# Altium footprint library Library.PcbLib: 292 footprints (part 7 of 20)
Each footprint in its own frame and in the unit in brackets; x right, y up, seen from the top. Pads: shape width x height; smd on the part's side, far side on the other; paste and mask are expansions set on the pad; w line width, h text height; cw(c..) or ccw(c..) is an arc to the next point about the centre after c.
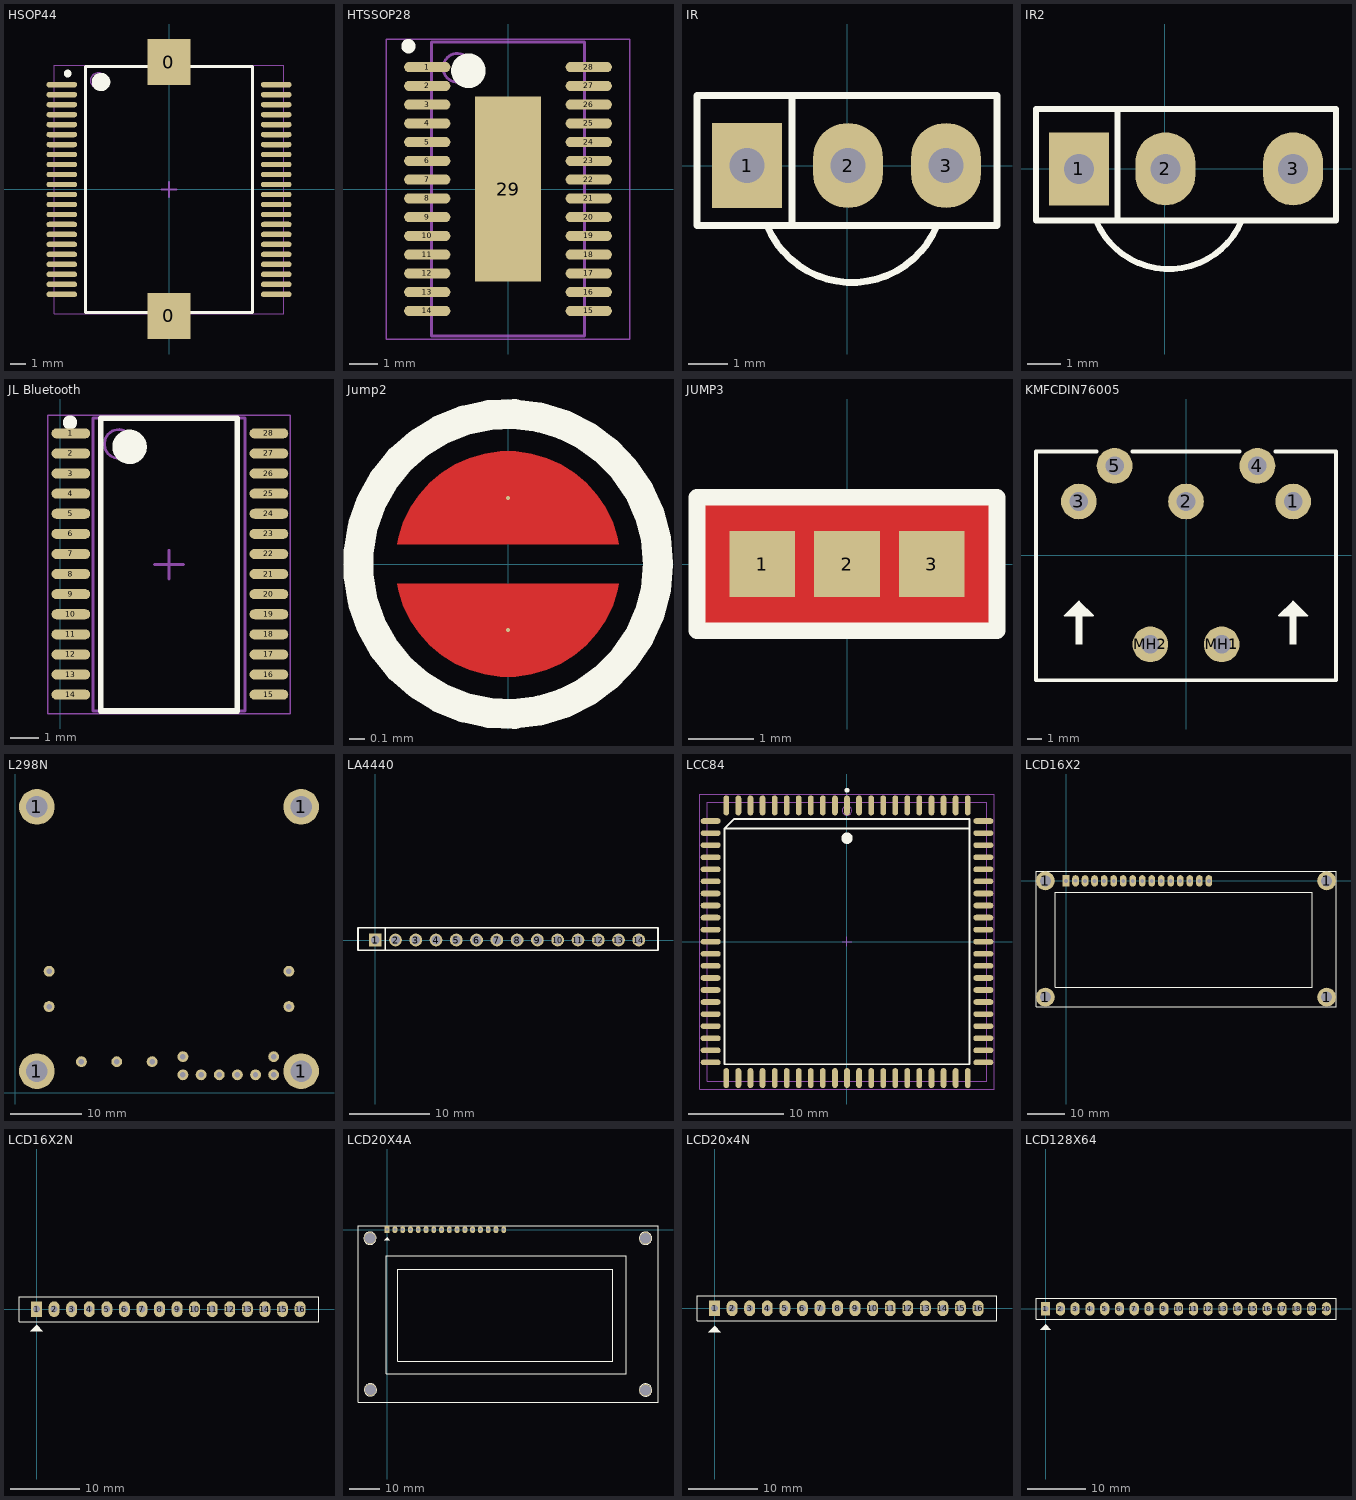
[diagram p6: the footprints below, top view; thin cyan lines are the x and y axes]

## HSOP44 [mm] "HSOP, 44-Leads, Body 16.00x11.00mm, Pitch 0.65mm, IPC High Density"
height 3
pads (46):
  rect 2.8x3 smd: 0(-0.012,-8.236) 0(-0.012,8.299)
  oval 2x0.35 smd: 1(-6.981,6.825) 2(-6.981,6.175) 3(-6.981,5.525) 4(-6.981,4.875) 5(-6.981,4.225) 6(-6.981,3.575) 7(-6.981,2.925) 8(-6.981,2.275) 9(-6.981,1.625) 10(-6.981,0.975) 11(-6.981,0.325) 12(-6.981,-0.325) 13(-6.981,-0.975) 14(-6.981,-1.625) 15(-6.981,-2.275) 16(-6.981,-2.925) 17(-6.981,-3.575) 18(-6.981,-4.225) 19(-6.981,-4.875) 20(-6.981,-5.525) 21(-6.981,-6.175) 22(-6.981,-6.825) 23(6.981,-6.825) 24(6.981,-6.175) 25(6.981,-5.525) 26(6.981,-4.875) 27(6.981,-4.225) 28(6.981,-3.575) 29(6.981,-2.925) 30(6.981,-2.275) 31(6.981,-1.625) 32(6.981,-0.975) 33(6.981,-0.325) 34(6.981,0.325) 35(6.981,0.975) 36(6.981,1.625) 37(6.981,2.275) 38(6.981,2.925) 39(6.981,3.575) 40(6.981,4.225) 41(6.981,4.875) 42(6.981,5.525) 43(6.981,6.175) 44(6.981,6.825)
Top Overlay:
  circle w0.6: c-4.425,7 r0.3
  circle w0.25: c-6.6,7.55 r0.125
  lines w0.2: -5.425,-8 5.425,-8 5.425,8 -5.425,8 -5.425,-8
Mechanical 13:
  circle w0.1: c-4.6,7.1 r0.5
  lines w0.1: -5.5,-8 5.5,-8 5.5,8 -5.5,8 -5.5,-8
Mechanical 15:
  lines w0.05: -7.475,-8.1 7.475,-8.1 7.475,8.1 -7.475,8.1 -7.475,-8.1
  lines w0.1: -0.5,0 0.5,0 ; 0,-0.5 0,0.5
3D body "User Library-HSOP Device (.step": height 3.4, standoff -0.05, extent -7.25,-8 7.25,8

## HTSSOP28 [mm] "HTSSOP, 28-Leads, Body 9.8x4.5mm, Pitch 0.65mm, IPC High Density"
height 1.2
pads (29):
  oval 1.6x0.35 smd: 1(-2.8,4.225) 2(-2.8,3.575) 3(-2.8,2.925) 4(-2.8,2.275) 5(-2.8,1.625) 6(-2.8,0.975) 7(-2.8,0.325) 8(-2.8,-0.325) 9(-2.8,-0.975) 10(-2.8,-1.625) 11(-2.8,-2.275) 12(-2.8,-2.925) 13(-2.8,-3.575) 14(-2.8,-4.225) 15(2.8,-4.225) 16(2.8,-3.575) 17(2.8,-2.925) 18(2.8,-2.275) 19(2.8,-1.625) 20(2.8,-0.975) 21(2.8,-0.325) 22(2.8,0.325) 23(2.8,0.975) 24(2.8,1.625) 25(2.8,2.275) 26(2.8,2.925) 27(2.8,3.575) 28(2.8,4.225)
  rect 2.3x6.4 smd: 29(0,0)
Top Overlay:
  circle w0.6: c-1.375,4.1 r0.3
  circle w0.25: c-3.45,4.95 r0.125
Mechanical 13:
  circle w0.1: c-1.75,4.2 r0.5
  lines w0.1: -2.65,-5.1 2.65,-5.1 2.65,5.1 -2.65,5.1 -2.65,-5.1
Mechanical 15:
  lines w0.05: -4.225,-5.2 4.225,-5.2 4.225,5.2 -4.225,5.2 -4.225,-5.2
  lines w0.1: -0.5,0 0.5,0 ; 0,-0.5 0,0.5
3D body "HTSSOP-28-1EP_4.4x9.7mm_P0.65mm_EP3.4x9.5mm.step": height 1.2, standoff 0, extent -3.2,-4.85 3.2,4.85

## IR [mil] "Receiver Infared IC"
height 200
pads (3):
  rect 70x85 hole 35: 1(-100,0)
  oval 70x85 hole 35: 2(1,0) 3(99,0)
Top Overlay:
  lines w7: -80,-60 ccw(c5,-25) 90,-60 ; -55,-60 -55,70 ; -150,-60 150,-60 150,70 -150,70 -150,-60
3D body "SW3dPS-TO92.STEP": height 245.04, standoff -199.79, extent -107.87,-99.53 109.87,61.03

## IR2 [mil] "Receiver Infared IC"
height 200
pads (3):
  rect 70x85 hole 35: 1(-100,0)
  oval 70x85 hole 35: 2(1,0) 3(150,0)
Top Overlay:
  lines w7: -80,-60 ccw(c5,-25) 90,-60 ; -55,-60 -55,70 ; -150,-60 200,-60 200,70 -150,70 -150,-60

## JL Bluetooth [mm]
pads (28):
  oval 1.35x0.35 smd: 1(0.364,13.612) 2(0.364,12.912) 3(0.364,12.212) 4(0.364,11.512) 5(0.364,10.812) 6(0.364,10.112) 7(0.364,9.412) 8(0.364,8.712) 9(0.364,8.012) 10(0.364,7.312) 11(0.364,6.612) 12(0.364,5.912) 13(0.364,5.212) 14(0.364,4.512) 15(7.264,4.512) 16(7.264,5.212) 17(7.264,5.912) 18(7.264,6.612) 19(7.264,7.312) 20(7.264,8.012) 21(7.264,8.712) 22(7.264,9.412) 23(7.264,10.112) 24(7.264,10.812) 25(7.264,11.512) 26(7.264,12.212) 27(7.264,12.912) 28(7.264,13.612)
Top Overlay:
  circle w0.6: c2.41,13.142 r0.3
  circle w0.25: c0.335,13.992 r0.125
  lines w0.2: 1.41,3.942 6.16,3.942 6.16,14.142 1.41,14.142 1.41,3.942
Mechanical 13:
  circle w0.1: c2.035,13.242 r0.5
  lines w0.1: 1.135,3.942 6.435,3.942 6.435,14.142 1.135,14.142 1.135,3.942
Mechanical 15:
  lines w0.05: -0.44,3.842 8.01,3.842 8.01,14.242 -0.44,14.242 -0.44,3.842
  lines w0.1: 3.285,9.042 4.285,9.042 ; 3.785,8.542 3.785,9.542

## Jump2 [mil]
pads (2):
  round 1 smd: 1(0,17.33) 2(0,-17.33)
Top Layer:
  region: 29.08,-5.13 28.72,-7.16 27.44,-11.09 25.63,-14.8 23.32,-18.22 20.56,-21.29 17.4,-23.95 13.9,-26.13 10.12,-27.81 6.15,-28.95 2.06,-29.53 -2.06,-29.53 -6.15,-28.95 -10.12,-27.81 -13.9,-26.13 -17.4,-23.95 -20.56,-21.29 -23.32,-18.22 -25.63,-14.8 -27.44,-11.09 -28.72,-7.16 -29.08,-5.13
  region: -29.08,5.13 -28.72,7.16 -27.44,11.09 -25.63,14.8 -23.32,18.22 -20.56,21.29 -17.4,23.95 -13.9,26.13 -10.12,27.81 -6.15,28.95 -2.06,29.53 2.06,29.53 6.15,28.95 10.12,27.81 13.9,26.13 17.4,23.95 20.56,21.29 23.32,18.22 25.63,14.8 27.44,11.09 28.72,7.16 29.08,5.13
Top Overlay:
  circle w7.87: c0,0 r39.37

## JUMP3 [mm]
pads (3):
  rect 1x1 smd: 1(-1.29,0) 2(0,0) 3(1.29,0)
Top Layer:
  pour cut-out: -2.286,-1.016 -2.286,1.016 2.286,1.016 2.286,-1.016
Top Overlay:
  lines w0.254: -2.286,-1.016 2.286,-1.016 2.286,1.016 -2.286,1.016 -2.286,-1.016

## KMFCDIN76005 [mm]
height 21.1
pads (7):
  round 2.5 hole 1.3: 1(7.5,3.75) 2(0,3.75) 3(-7.5,3.75) 4(5,6.25) 5(-5,6.25) MH1(2.5,-6.25) MH2(-2.5,-6.25)
Top Overlay:
  region: 7.75,-4.25 7.25,-4.25 7.25,-6.25 7.75,-6.25
  rectangle: -7.75,-6.25 -7.25,-4.25
  region: 8.5,-4.25 7.5,-3.25 6.5,-4.25
  region: -8.5,-4.25 -7.5,-3.25 -6.5,-4.25
  lines w0.127: -8.5,-4.25 -6.5,-4.25 -7.5,-3.25 -8.5,-4.25 ; 6.5,-4.25 8.5,-4.25 7.5,-3.25 6.5,-4.25
  lines w0.254: -6.25,7.25 -10.5,7.25 -10.5,-8.75 10.5,-8.75 10.5,7.25 6.25,7.25 ; -3.75,7.25 3.75,7.25
3D body "pin.stp": height 12.87, standoff -2.91, extent 0.427,5.764 5.72,7.313
3D body "5PINDIN.STEP": height 21.4, standoff -3.5, extent -10.34,-8.95 10.36,6.05
3D body "pin.stp": height 12.87, standoff -2.91, extent -5.72,5.087 -0.428,6.636
3D body: height 13.2, standoff 12, extent -0.89,4.62 -0.359,6.72
3D body: height 13.2, standoff 12, extent 0.39,4.64 0.921,6.74

## L298N [mil] "Module"
pads (19):
  round 196.85 hole 118.11: 1(118.11,118.11) 1(118.11,1574.8) 1(1574.8,118.11) 1(1574.8,1574.8)
  round 60 hole 30: +5V(753.31,170.26) +5V(923.26,197.89) +5V(1423.34,197.89) +12V(363.94,170.26) ENA(923.26,97.87) ENB(1423.34,97.87) GND(558.63,170.26) IN1(1023.28,97.87) IN2(1123.29,97.87) IN3(1223.31,97.87) IN4(1323.32,97.87) OUT1(185.43,668.92) OUT2(185.43,474.23) OUT3(1507.47,474.23) OUT4(1507.47,668.92)
3D body "User Library-L298N-3.step": height 1122.44, standoff -39.37, extent 0,-14.76 1692.91,1707.68

## LA4440 [mm]
height 8.54
pads (14):
  rect 1.6x1.6 hole 1.1: 1(0,0)
  round 1.6 hole 1.1: 2(2.54,0) 3(5.08,0) 4(7.62,0) 5(10.16,0) 6(12.7,0) 7(15.24,0) 8(17.78,0) 9(20.32,0) 10(22.86,0) 11(25.4,0) 12(27.94,0) 13(30.48,0) 14(33.02,0)
Top Overlay:
  lines w0.2: 1.27,-1.27 1.27,1.524 ; -2.159,-1.27 -2.159,1.524 0.889,1.524 35.433,1.524 35.433,-1.27 -2.159,-1.27
3D body: height 15, standoff 4.5, extent -2.159,-1.397 35.433,1.651
3D body "61301411121.stp": height 10.17, standoff -1.37, extent -1.27,-1.27 34.29,1.27

## LCC84 [mm] "Leaded Chip Carrier, 84-Leads, Body 29.3x29.3mm, Pitch 1.27mm, IPC High Density"
height 5.08
pads (84):
  oval 0.6x2.1 smd: 1(0,14.35) 2(-1.27,14.35) 3(-2.54,14.35) 4(-3.81,14.35) 5(-5.08,14.35) 6(-6.35,14.35) 7(-7.62,14.35) 8(-8.89,14.35) 9(-10.16,14.35) 10(-11.43,14.35) 11(-12.7,14.35) 33(-12.7,-14.35) 34(-11.43,-14.35) 35(-10.16,-14.35) 36(-8.89,-14.35) 37(-7.62,-14.35) 38(-6.35,-14.35) 39(-5.08,-14.35) 40(-3.81,-14.35) 41(-2.54,-14.35) 42(-1.27,-14.35) 43(0,-14.35) 44(1.27,-14.35) 45(2.54,-14.35) 46(3.81,-14.35) 47(5.08,-14.35) 48(6.35,-14.35) 49(7.62,-14.35) 50(8.89,-14.35) 51(10.16,-14.35) 52(11.43,-14.35) 53(12.7,-14.35) 75(12.7,14.35) 76(11.43,14.35) 77(10.16,14.35) 78(8.89,14.35) 79(7.62,14.35) 80(6.35,14.35) 81(5.08,14.35) 82(3.81,14.35) 83(2.54,14.35) 84(1.27,14.35)
  oval 2.1x0.6 smd: 12(-14.35,12.7) 13(-14.35,11.43) 14(-14.35,10.16) 15(-14.35,8.89) 16(-14.35,7.62) 17(-14.35,6.35) 18(-14.35,5.08) 19(-14.35,3.81) 20(-14.35,2.54) 21(-14.35,1.27) 22(-14.35,0) 23(-14.35,-1.27) 24(-14.35,-2.54) 25(-14.35,-3.81) 26(-14.35,-5.08) 27(-14.35,-6.35) 28(-14.35,-7.62) 29(-14.35,-8.89) 30(-14.35,-10.16) 31(-14.35,-11.43) 32(-14.35,-12.7) 54(14.35,-12.7) 55(14.35,-11.43) 56(14.35,-10.16) 57(14.35,-8.89) 58(14.35,-7.62) 59(14.35,-6.35) 60(14.35,-5.08) 61(14.35,-3.81) 62(14.35,-2.54) 63(14.35,-1.27) 64(14.35,0) 65(14.35,1.27) 66(14.35,2.54) 67(14.35,3.81) 68(14.35,5.08) 69(14.35,6.35) 70(14.35,7.62) 71(14.35,8.89) 72(14.35,10.16) 73(14.35,11.43) 74(14.35,12.7)
Top Overlay:
  circle w0.25: c0,15.95 r0.125
  circle w0.6: c0,10.9 r0.3
  lines w0.2: 12.9,11.9 -12.9,11.9 ; -12.9,11.9 -11.9,12.9 12.9,12.9 12.9,-12.9 -12.9,-12.9 -12.9,11.9
Mechanical 13:
  circle w0.1: c0,13.805 r0.5
  lines w0.1: -14.705,-14.705 -14.705,14.705 14.705,14.705 14.705,-14.705 -14.705,-14.705
Mechanical 15:
  lines w0.1: -0.5,0 0.5,0 ; 0,-0.5 0,0.5 ; -15.5,-15.5 -15.5,15.5 15.5,15.5 15.5,-15.5 -15.5,-15.5
3D body "LCC127P2930X2930X200-84N.step": height 2, standoff 0, extent -14.605,-14.568 14.695,14.732

## LCD16X2 [mm] "LCD dipslay 16x2, 16 pin"
height 10.16
pads (21):
  round 5 hole 3: 1(-5.5,-31) 1(-5.5,0) 1(69.5,-31) 1(69.5,0)
  rect 1.778x3.048 hole 1: 1(0,0)
  oval 1.778x3.048 hole 1: 2(2.54,0) 3(5.08,0) 4(7.62,0) 5(10.16,0) 6(12.7,0) 7(15.24,0) 8(17.78,0) 9(20.32,0) 10(22.86,0) 11(25.4,0) 12(27.94,0) 13(30.48,0) 14(33.02,0) 15(35.56,0) 16(38.1,0)
  round 0 all layers, no hole: ""(-5.5,0)
Top Overlay:
  lines w0.2: -8,-33.5 72,-33.5 72,2.5 -8,2.5 -8,-33.5 ; -2.921,-28.423 65.659,-28.423 65.659,-3.023 -2.921,-3.023 -2.921,-28.423
3D body "LCD module 16 X 2 backlight.STEP": height 18.14, standoff 4.93, extent -7.865,-33.96 72.635,2.54
3D body "jp16.stp": height 11.89, standoff -0.51, extent -1.219,-1.321 39.321,1.179
3D body "socket16.stp": height 7.02, standoff -2.98, extent -1.207,-1.333 39.433,1.207

## LCD16X2N [mil] "LCD dipslay 16x2, 16 pin"
height 400
pads (16):
  rect 62x90 hole 39: 1(0,0)
  oval 62x90 hole 39: 2(100,0) 3(200,0) 4(300,0) 5(400,0) 6(500,0) 7(600,0) 8(700,0) 9(800,0) 10(900,0) 11(1000,0) 12(1100,0) 13(1200,0) 14(1300,0) 15(1400,0) 16(1500,0)
Top Overlay:
  region: 0,-90 -35,-125 35,-125
  lines w7: -100,-71 1608,-71 1608,70 -100,70 -100,-71
3D body "lcd16.STEP": height 764, standoff 244, extent -319.64,-1353.49 2849.65,83.51
3D body "jp16.stp": height 468.11, standoff -20.08, extent -48.03,-48.43 1548.03,50
3D body "socket16.stp": height 276.19, standoff -117.51, extent -49,-49 1551,51

## LCD20X4A [mil] "LCD dipslay 20x4, 16 pin"
height 400
pads (20):
  rect 62x90 hole 39: 1(0,0)
  oval 62x90 hole 39: 2(100,0) 3(200,0) 4(300,0) 5(400,0) 6(500,0) 7(600,0) 8(700,0) 9(800,0) 10(900,0) 11(1000,0) 12(1100,0) 13(1200,0) 14(1300,0) 15(1400,0) 16(1500,0)
  round 157.48 hole 137.8: "Hole 0"(-220,-110) "Hole 0"(-215,-2060) "Hole 0"(3325,-2065) "Hole 0"(3325,-110)
Top Overlay:
  circle w7: c3324.94,-2063 r79.06
  circle w7: c3324.94,-110 r79.06
  circle w7: c-221.06,-110 r79.06
  circle w7: c-215.06,-2061 r79.06
  region: 0,-100 -35,-135 35,-135
  lines w7: -375,-2220 -375,50 3485,50 3485,-2220 -374,-2220 ; -11,-1852 -11,-337 3076,-337 3076,-1852 -11,-1852 ; 139,-1695 139,-512 2905,-512 2905,-1695 139,-1695
3D body "User Library-LCD20_4.STEP": height 417.32, standoff -125.98, extent -392.13,-2264.2 3466.13,98

## LCD20x4N [mil] "LCD dipslay 20x4, 16 pin"
height 400
pads (16):
  rect 62x90 hole 39: 1(0,0)
  oval 62x90 hole 39: 2(100,0) 3(200,0) 4(300,0) 5(400,0) 6(500,0) 7(600,0) 8(700,0) 9(800,0) 10(900,0) 11(1000,0) 12(1100,0) 13(1200,0) 14(1300,0) 15(1400,0) 16(1500,0)
Top Overlay:
  region: 0,-100 -35,-135 35,-135
  lines w7: -100,-71 1608,-71 1608,70 -100,70 -100,-71
3D body "User Library-LCD20_4.STEP": height 417.32, standoff -125.98, extent -392,-2265.2 3466.27,97

## LCD128X64 [mil] "LCD Graphic 128x64, 20 pin"
height 400
pads (20):
  rect 62x90 hole 39: 1(0,0)
  oval 62x90 hole 39: 2(100,0) 3(200,0) 4(300,0) 5(400,0) 6(500,0) 7(600,0) 8(700,0) 9(800,0) 10(900,0) 11(1000,0) 12(1100,0) 13(1200,0) 14(1300,0) 15(1400,0) 16(1500,0) 17(1600,0) 18(1700,0) 19(1800,0) 20(1900,0)
Top Overlay:
  region: 0,-105 -35,-140 35,-140
  lines w7: -65,-71 -65,70 1965,70 1965,-71 -65,-71
3D body "User Library-GRAPHIC LCD WG12864B.STEP": height 475.59, standoff -130.71, extent -614.8,-2075.98 2534.8,50